# Altium footprint library XTIDA-010086.PcbLib: 88 footprints (part 1 of 6)
Each footprint in its own frame and in the unit in brackets; x right, y up, seen from the top. Pads: shape width x height; smd on the part's side, far side on the other; paste and mask are expansions set on the pad; w line width, h text height; cw(c..) or ccw(c..) is an arc to the next point about the centre after c.
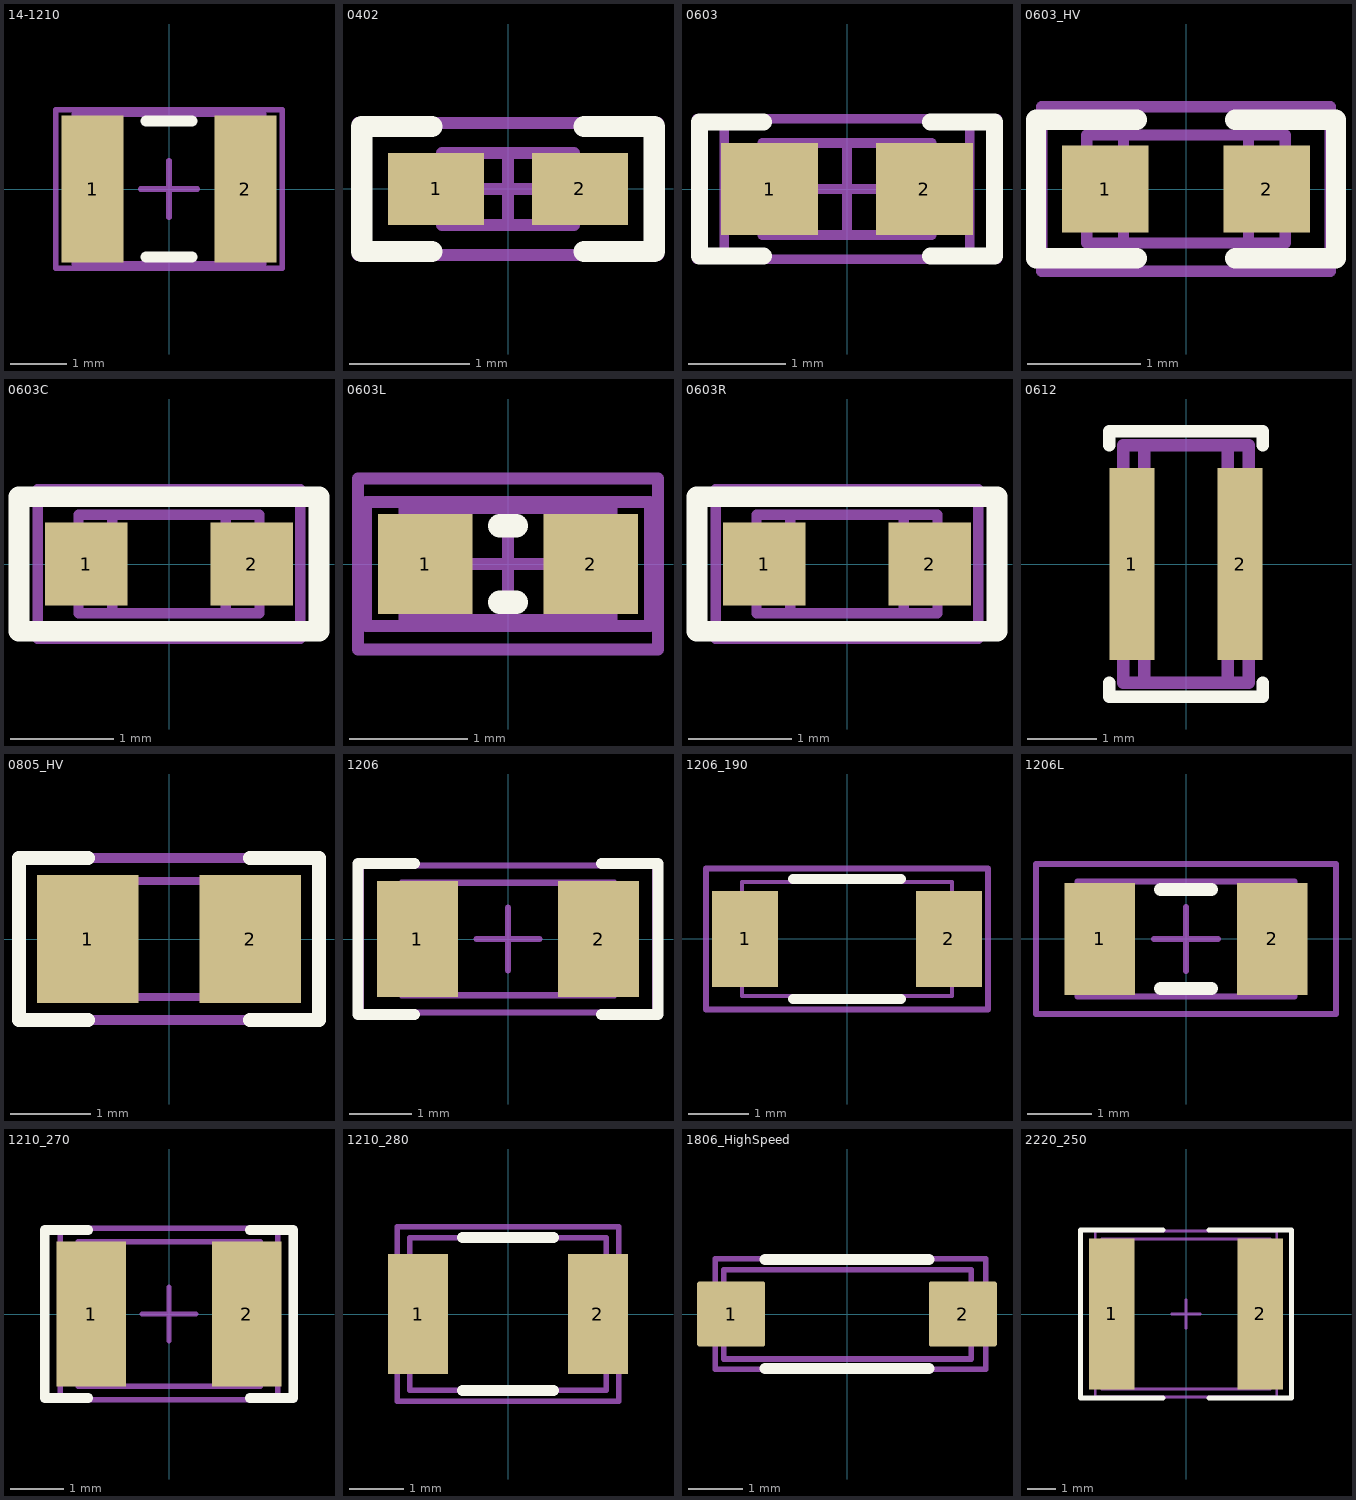
[diagram p0: the footprints below, top view; thin cyan lines are the x and y axes]

## 14-1210 [mm] "Chip Resistor, Body 3.2x2.5mm, IPC High Density"
height 0.9
pads (2):
  rect 1.1x2.6 smd: 1(-1.35,0) 2(1.35,0)
Top Overlay:
  lines w0.2: -0.4,-1.2 0.4,-1.2 ; -0.4,1.2 0.4,1.2
Mechanical 5:
  lines w0.1: -2,-1.4 -2,1.4 2,1.4 2,-1.4 -2,-1.4
  text ".Designator" at -2.999,-0.2 h0.6
Mechanical 13:
  lines w0.1: -1.675,-1.32 -1.675,1.32 1.675,1.32 1.675,-1.32 -1.675,-1.32
Mechanical 15:
  lines w0.1: -0.5,0 0.5,0 ; 0,-0.5 0,0.5
3D body: height 0.9, standoff 0, extent -1.675,-1.32 1.675,1.32

## 0402 [mm] "0402 from SM-752 data"
height 0.6
pads (2):
  rect 0.8x0.6 smd: 1(-0.6,0) 2(0.6,0)
Top Overlay:
  lines w0.178: -0.635,-0.521 -1.219,-0.521 -1.219,0.521 -0.635,0.521 ; 0.635,-0.521 1.219,-0.521 1.219,0.521 0.635,0.521
Mechanical 5:
  lines w0.1: -1.25,-0.55 1.25,-0.55 1.25,0.55 -1.25,0.55 -1.25,-0.55
  text ".Designator" at -2.249,-0.15 h0.45
Mechanical 13:
  lines w0.1: -0.35,-0.3 -0.35,0.3 ; 0.35,-0.3 0.35,0.3 ; -0.55,-0.3 -0.55,0.3 0.55,0.3 0.55,-0.3 -0.55,-0.3
Mechanical 15:
  lines w0.1: -0.3,0 0.3,0 ; 0,-0.3 0,0.3 ; -1.25,-0.55 -1.25,0.55 1.25,0.55 1.25,-0.55 -1.25,-0.55
3D body: height 0.6, standoff 0, extent -0.549,-0.299 -0.351,0.299
3D body: height 0.6, standoff 0, extent -0.349,-0.299 0.349,0.299
3D body: height 0.6, standoff 0, extent 0.351,-0.299 0.549,0.299

## 0603 [mm] "0603 from SM-752 data"
height 1
pads (2):
  rect 1x0.95 smd: 1(-0.8,0) 2(0.8,0)
Top Overlay:
  lines w0.178: -0.864,-0.691 -1.524,-0.691 -1.524,0.693 -0.864,0.693 ; 0.864,-0.691 1.524,-0.691 1.524,0.693 0.864,0.693
Mechanical 5:
  lines w0.1: -1.27,-0.725 -1.27,0.725 1.27,0.725 1.27,-0.725 -1.27,-0.725
  text ".Designator" at -2.249,-0.15 h0.45
Mechanical 13:
  lines w0.1: -0.55,-0.475 -0.55,0.475 ; 0.55,-0.475 0.55,0.475 ; -0.875,-0.475 -0.875,0.475 0.875,0.475 0.875,-0.475 -0.875,-0.475
Mechanical 15:
  lines w0.1: -0.475,0 0.475,0 ; 0,-0.475 0,0.475 ; -1.55,-0.725 -1.55,0.725 1.55,0.725 1.55,-0.725 -1.55,-0.725
3D body: height 1, standoff 0, extent 0.551,-0.474 0.874,0.474
3D body: height 1, standoff 0, extent -0.549,-0.474 0.549,0.474
3D body: height 1, standoff 0, extent -0.874,-0.474 -0.551,0.474

## 0603_HV [mil] "Ernesto recommended land pattern.  26 mil between pads."
height 39.37
pads (2):
  rect 30x30 smd: 1(-28,0) 2(28,0)
Top Overlay:
  lines w7: -17,-24 -52,-24 -52,0 -52,24 -17,24 ; 17,-24 52,-24 52,0 52,24 17,24
Mechanical 5:
  lines w3.94: -50,-28.54 -50,28.54 50,28.54 50,-28.54 -50,-28.54
  text ".Designator" at -88.55,-5.9 h17.72
Mechanical 13:
  lines w3.94: -21.65,-18.7 -21.65,18.7 ; 21.65,-18.7 21.65,18.7 ; -34.45,-18.7 -34.45,18.7 34.45,18.7 34.45,-18.7 -34.45,-18.7
3D body: height 39.37, standoff 0, extent 21.67,-18.68 34.43,18.68
3D body: height 39.37, standoff 0, extent -21.63,-18.68 21.63,18.68
3D body: height 39.37, standoff 0, extent -34.43,-18.68 -21.67,18.68

## 0603C [mm]
height 0.6
pads (2):
  rect 0.8x0.8 smd paste-10: 1(-0.8,0) 2(0.8,0)
Top Overlay:
  lines w0.2: -1.45,-0.65 1.45,-0.65 1.45,0.65 -1.45,0.65 -1.45,-0.65
Top Paste:
  region: -1.2,-0.4 -1.2,0.4 -0.65,0.4 -0.4,0 -0.65,-0.4
  region: 1.2,-0.4 1.2,0.4 0.65,0.4 0.4,0 0.65,-0.4
Mechanical 5:
  lines w0.1: -1.27,-0.725 -1.27,0.725 1.27,0.725 1.27,-0.725 -1.27,-0.725
  text ".Designator" at -2.249,-0.15 h0.45
Mechanical 13:
  lines w0.1: -0.55,-0.475 -0.55,0.475 ; 0.55,-0.475 0.55,0.475 ; -0.875,-0.475 -0.875,0.475 0.875,0.475 0.875,-0.475 -0.875,-0.475
3D body "0603C.STEP": height 1.02, standoff 0, extent -0.8,-0.405 0.8,0.405

## 0603L [mm] "0603 from SM-752 data"
height 1
pads (2):
  rect 0.8x0.85 smd: 1(-0.7,0) 2(0.7,0)
Top Overlay:
  lines w0.2: -0.071,-0.325 0.071,-0.325 ; -0.071,0.325 0.071,0.325
Mechanical 5:
  lines w0.1: -1.27,-0.725 -1.27,0.725 1.27,0.725 1.27,-0.725 -1.27,-0.725
  text ".Designator" at -2.249,-0.15 h0.45
Mechanical 13:
  lines w0.1: -0.55,-0.475 -0.55,0.475 ; 0.55,-0.475 0.55,0.475 ; -0.875,-0.475 0.875,-0.475 0.875,0.475 -0.875,0.475 -0.875,-0.475
Mechanical 15:
  lines w0.1: -0.475,0 0.475,0 ; 0,-0.475 0,0.475 ; -1.2,-0.525 -1.2,0.525 1.2,0.525 1.2,-0.525 -1.2,-0.525
3D body: height 1, standoff 0, extent -0.874,-0.474 -0.551,0.474
3D body: height 1, standoff 0, extent -0.549,-0.474 0.549,0.474
3D body: height 1, standoff 0, extent 0.551,-0.474 0.874,0.474

## 0603R [mm]
height 0.6
pads (2):
  rect 0.8x0.8 smd paste-10: 1(-0.8,0) 2(0.8,0)
Top Overlay:
  lines w0.2: -1.45,-0.65 1.45,-0.65 1.45,0.65 -1.45,0.65 -1.45,-0.65
Top Paste:
  region: 1.2,-0.4 1.2,0.4 0.65,0.4 0.4,0 0.65,-0.4
  region: -1.2,-0.4 -1.2,0.4 -0.65,0.4 -0.4,0 -0.65,-0.4
Mechanical 5:
  lines w0.1: -1.27,-0.725 -1.27,0.725 1.27,0.725 1.27,-0.725 -1.27,-0.725
  text ".Designator" at -2.249,-0.15 h0.45
Mechanical 13:
  lines w0.1: -0.55,-0.475 -0.55,0.475 ; 0.55,-0.475 0.55,0.475 ; -0.875,-0.475 -0.875,0.475 0.875,0.475 0.875,-0.475 -0.875,-0.475
3D body "0603R.STEP": height 0.45, standoff 0, extent -0.8,-0.4 0.8,0.4

## 0612 [mm] "Panasonic recommended land pattern, fb97d03ed01.pdf dated April 2008"
height 0.85
pads (2):
  rect 0.65x2.75 smd: 1(-0.775,0) 2(0.775,0)
Top Overlay:
  lines w0.178: -1.1,-1.7 -1.1,-1.9 0,-1.9 1.1,-1.9 1.1,-1.7 ; -1.1,1.7 -1.1,1.9 0,1.9 1.1,1.9 1.1,1.7
Mechanical 5:
  lines w0.127: -0.9,-1.7 0,-1.7 0.9,-1.7 0.9,0 0.9,1.7 0,1.7 -0.9,1.7 -0.9,0 -0.9,-1.7
  text ".Designator" at 0.15,-2.249 h0.45
Mechanical 13:
  lines w0.178: -0.6,-1.7 -0.6,0 -0.6,1.7 ; 0.6,-1.7 0.6,0 0.6,1.7 ; -0.9,-1.7 -0.9,0 -0.9,1.7 0,1.7 0.9,1.7 0.9,0 0.9,-1.7 0,-1.7 -0.9,-1.7
3D body: height 0.85, standoff 0, extent 0.601,-1.699 0.899,1.699
3D body: height 0.85, standoff 0, extent -0.599,-1.699 0.599,1.699
3D body: height 0.85, standoff 0, extent -0.899,-1.699 -0.601,1.699

## 0805_HV [mil] "0805 with 30mil clearance between pads"
height 57.09
pads (2):
  rect 50x63 smd: 1(-40,0) 2(40,0)
Top Overlay:
  lines w7: -40,-40 -74,-40 -74,0 -74,40 -40,40 ; 40,-40 74,-40 74,0 74,40 40,40
Mechanical 5:
  lines w5: -74,-40 -74,40 74,40 74,-40 -74,-40
  text ".Designator" at -88.55,-5.9 h17.72
Mechanical 13:
  lines w3.94: -25.59,-28.54 -25.59,28.54 ; 25.59,-28.54 25.59,28.54 ; -43.31,-28.54 -43.31,28.54 43.31,28.54 43.31,-28.54 -43.31,-28.54
3D body: height 57.09, standoff 0, extent 25.61,-28.52 43.29,28.52
3D body: height 57.09, standoff 0, extent -25.57,-28.52 25.57,28.52
3D body: height 57.09, standoff 0, extent -43.29,-28.52 -25.61,28.52

## 1206 [mm] "1206 from SM-752 data"
height 1.35
pads (2):
  rect 1.3x1.85 smd: 1(-1.45,0) 2(1.45,0)
Top Overlay:
  lines w0.178: -1.5,-1.21 -2.4,-1.21 -2.4,1.21 -1.5,1.21 ; 1.5,-1.21 2.4,-1.21 2.4,1.21 1.5,1.21
Mechanical 5:
  lines w0.1: -2.35,-1.175 -2.35,1.175 2.35,1.175 2.35,-1.175 -2.35,-1.175
  text ".Designator" at -2.999,-0.2 h0.6
Mechanical 13:
  lines w0.1: -1.2,-0.9 -1.2,0.9 ; 1.2,-0.9 1.2,0.9 ; -1.7,-0.9 -1.7,0.9 ; -1.7,-0.9 1.7,-0.9 ; -1.7,-0.9 -1.7,0.9 ; -1.7,-0.9 1.7,-0.9 ; -1.7,0.9 1.7,0.9 ; -1.7,0.9 1.7,0.9 ; 1.7,-0.9 1.7,0.9 ; 1.7,-0.9 1.7,0.9
Mechanical 15:
  lines w0.1: -0.5,0 0.5,0 ; 0,-0.5 0,0.5
3D body: height 1.35, standoff 0, extent 1.201,-0.899 1.699,0.899
3D body: height 1.35, standoff 0, extent -1.199,-0.899 1.199,0.899
3D body: height 1.35, standoff 0, extent -1.699,-0.899 -1.201,0.899

## 1206_190 [mm] "1206_190"
height 1.9
pads (2):
  rect 1.1x1.6 smd: 1(-1.7,0) 2(1.7,0)
Top Overlay:
  lines w0.17: -0.9,-1 0.9,-1 ; -0.9,1 0.9,1
Mechanical 5:
  lines w0.1: -2.35,-1.175 2.35,-1.175 2.35,1.175 -2.35,1.175 -2.35,-1.175
  text ".Designator" at -2.999,-0.2 h0.6
Mechanical 13:
  lines w0.07: -1.75,-0.95 -1.75,0.95 1.75,0.95 1.75,-0.95 -1.75,-0.95
3D body: height 1.9, standoff 0, extent 1.301,-0.949 1.749,0.949
3D body: height 1.9, standoff 0, extent -1.299,-0.949 1.299,0.949
3D body: height 1.9, standoff 0, extent -1.749,-0.949 -1.301,0.949

## 1206L [mm] "1206 from SM-752 data"
height 1.35
pads (2):
  rect 1.1x1.75 smd: 1(-1.35,0) 2(1.35,0)
Top Overlay:
  lines w0.2: -0.4,-0.775 0.4,-0.775 ; -0.4,0.775 0.4,0.775
Mechanical 5:
  lines w0.1: -2.35,-1.175 2.35,-1.175 2.35,1.175 -2.35,1.175 -2.35,-1.175
  text ".Designator" at -2.999,-0.2 h0.6
Mechanical 13:
  lines w0.1: -1.2,-0.9 -1.2,0.9 ; 1.2,-0.9 1.2,0.9 ; -1.7,-0.9 -1.7,0.9 ; -1.7,-0.9 1.7,-0.9 ; -1.7,-0.9 1.7,-0.9 ; -1.7,-0.9 -1.7,0.9 ; -1.7,0.9 1.7,0.9 ; -1.7,0.9 1.7,0.9 ; 1.7,-0.9 1.7,0.9 ; 1.7,-0.9 1.7,0.9
Mechanical 15:
  lines w0.1: -0.5,0 0.5,0 ; 0,-0.5 0,0.5
3D body: height 1.35, standoff 0, extent -1.699,-0.899 -1.201,0.899
3D body: height 1.35, standoff 0, extent -1.199,-0.899 1.199,0.899
3D body: height 1.35, standoff 0, extent 1.201,-0.899 1.699,0.899

## 1210_270 [mm] "1210"
height 2.7
pads (2):
  rect 1.3x2.7 smd: 1(-1.45,0) 2(1.45,0)
Top Overlay:
  lines w0.178: -1.511,-1.568 -2.316,-1.568 -2.316,1.568 -1.511,1.568 ; 1.511,-1.568 2.316,-1.568 2.316,1.568 1.511,1.568
Mechanical 5:
  lines w0.1: -2.032,-1.6 -2.032,1.6 2.032,1.6 2.032,-1.6 -2.032,-1.6
  text ".Designator" at -2.999,-0.2 h0.6
Mechanical 13:
  lines w0.1: -1.2,-1.35 -1.2,1.35 ; 1.2,-1.35 1.2,1.35 ; -1.7,-1.35 1.7,-1.35 ; -1.7,-1.35 -1.7,1.35 ; -1.7,-1.35 1.7,-1.35 ; -1.7,-1.35 -1.7,1.35 ; -1.7,1.35 1.7,1.35 ; -1.7,1.35 1.7,1.35 ; 1.7,-1.35 1.7,1.35 ; 1.7,-1.35 1.7,1.35
Mechanical 15:
  lines w0.1: -0.5,0 0.5,0 ; 0,-0.5 0,0.5
3D body: height 2.7, standoff 0, extent 1.201,-1.349 1.699,1.349
3D body: height 2.7, standoff 0, extent -1.199,-1.349 1.199,1.349
3D body: height 2.7, standoff 0, extent -1.699,-1.349 -1.201,1.349

## 1210_280 [mm] "SMD, 2-Leads, Body 3.6x2.8mm, Height 2.8mm"
height 2.8
pads (2):
  rect 1.1x2.2 smd: 1(-1.65,0) 2(1.65,0)
Top Overlay:
  lines w0.2: -0.835,-1.4 0.835,-1.4 ; -0.835,1.4 0.835,1.4
Mechanical 5:
  lines w0.1: -2.032,-1.6 2.032,-1.6 2.032,1.6 -2.032,1.6 -2.032,-1.6
  text ".Designator" at -2.999,-0.2 h0.6
Mechanical 13:
  lines w0.1: -1.8,-1.4 -1.8,1.4 1.8,1.4 1.8,-1.4 -1.8,-1.4
3D body: height 2.8, standoff 0, extent 1.6,-1.4 1.8,1.4
3D body: height 2.8, standoff 0, extent -1.6,-1.4 1.6,1.4
3D body: height 2.8, standoff 0, extent -1.8,-1.4 -1.6,1.4

## 1806_HighSpeed [mm] "Wurth recommended land pattern"
height 1.85
pads (2):
  rrect8% 1.25x1.2 smd: 1(-2.125,0) 2(2.125,0)
Top Overlay:
  lines w0.2: -1.5,-1 1.5,-1 ; -1.5,1 1.5,1
Mechanical 5:
  lines w0.1: -2.413,-1.016 -2.413,1.016 2.54,1.016 2.54,-1.016 -2.413,-1.016
  text ".Designator" at -2.999,-0.2 h0.6
Mechanical 13:
  lines w0.102: -2.261,-0.825 2.274,-0.825 2.274,0.815 -2.261,0.815 -2.261,-0.825
3D body "1806.stp": height 1.61, standoff 0.01, extent -2.25,-0.8 2.25,0.8

## 2220_250 [mm] "2220"
height 2.5
pads (2):
  rect 1.6x5.3 smd: 1(-2.6,0) 2(2.6,0)
Top Overlay:
  lines w0.178: -0.811,-2.939 -3.693,-2.939 -3.693,2.939 -0.811,2.939 ; 0.811,-2.939 3.693,-2.939 3.693,2.939 0.811,2.939
Mechanical 5:
  lines w0.1: -3.175,-2.9 3.175,-2.9 3.175,2.9 -3.175,2.9 -3.175,-2.9 ; -2.95,-2.625 2.95,-2.625 2.95,2.625 -2.95,2.625 -2.95,-2.625
  text ".Designator" at -3.749,-0.25 h0.75
Mechanical 13:
  lines w0.1: -2.75,-2.625 -2.75,2.625 ; 2.75,-2.625 2.75,2.625 ; -2.95,-2.625 -2.95,2.625 2.95,2.625 2.95,-2.625 -2.95,-2.625
Mechanical 15:
  lines w0.1: -0.5,0 0.5,0 ; 0,-0.5 0,0.5
3D body: height 2.5, standoff 0, extent -2.949,-2.624 -2.751,2.624
3D body: height 2.5, standoff 0, extent -2.749,-2.624 2.749,2.624
3D body: height 2.5, standoff 0, extent 2.751,-2.624 2.949,2.624